# Altium footprint library General.PCBLIB: 231 footprints (part 2 of 15)
Each footprint in its own frame and in the unit in brackets; x right, y up, seen from the top. Pads: shape width x height; smd on the part's side, far side on the other; paste and mask are expansions set on the pad; w line width, h text height; cw(c..) or ccw(c..) is an arc to the next point about the centre after c.
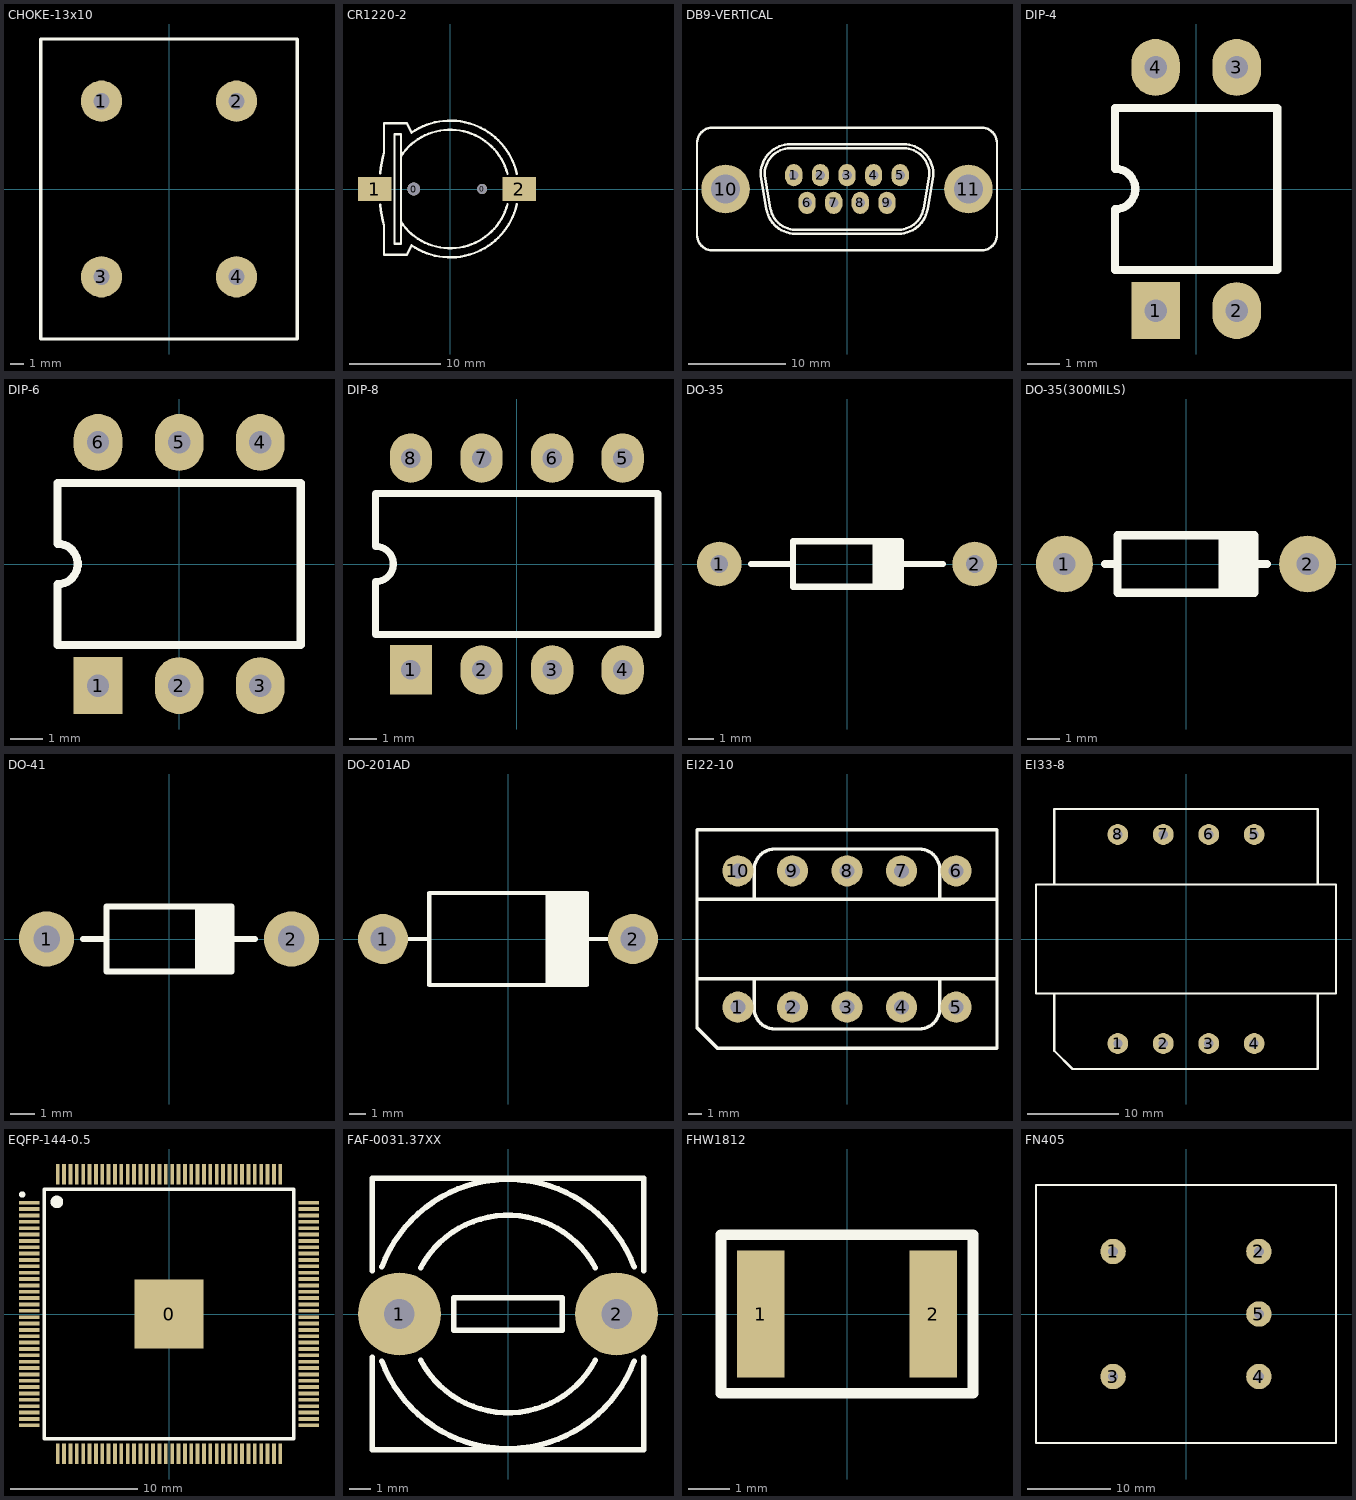
[diagram p1: the footprints below, top view; thin cyan lines are the x and y axes]

## CHOKE-13x10 [mm] "Choke"
height 27.2
pads (4):
  round 3.048 hole 1.2: 1(-5,6.5) 2(5,6.5) 3(-5,-6.5) 4(5,-6.5)
Top Overlay:
  lines w0.254: -9.5,-11.1 -9.5,11.1 9.5,11.1 9.5,-11.1 -9.5,-11.1
3D body "Choke_13x10.step": height 27.18, standoff -3.6, extent -9.5,-11.1 9.5,11.058

## CR1220-2 [mm]
pads (4):
  round 1.4 hole 1.4 unplated: 0(-4,0)
  round 1.1 hole 1.1 unplated: 0(3.5,0)
  rect 3.66x2.6 smd: 1(-8.28,0) 2(7.57,0)
Top Overlay:
  lines w0.254: -7.685,-1.73 ccw(c7.5,0) -7.25,-4 -7.25,-7.2 -4.75,-7.2 -4.25,-6.18 ccw(c0,0) 7.308,-1.687 ; -7.685,1.73 cw(c7.5,0) -7.25,4 -7.25,7.2 -4.75,7.2 -4.25,6.18 cw(c0,0) 7.308,1.687 ; -5.399,-3.619 ccw(c0,0) 6.279,-1.682 ; -5.399,3.619 cw(c0,0) 6.279,1.682 ; -6.1,-6 -5.4,-6 -5.4,6 -6.1,6 -6.1,-6
3D body "CR1220.STEP": height 4, standoff -0.94, extent -9.5,-7.5 9,7.497

## DB9-VERTICAL [mm] "D-Subminiature Connector"
height 12
pads (11):
  oval 1.778x2.286 hole 1: 1(-5.48,1.42) 2(-2.74,1.42) 3(0,1.42) 4(2.74,1.42) 5(5.48,1.42) 6(-4.11,-1.42) 7(-1.37,-1.42) 8(1.37,-1.42) 9(4.11,-1.42)
  round 5 / inner round 3 / far side round 7.5 hole 3: 10(-12.495,0) 11(12.495,0)
Top Overlay:
  lines w0.254: -15.443,-4.724 ccw(c-13.868,-4.724) -13.868,-6.299 13.868,-6.299 ccw(c13.868,-4.724) 15.443,-4.724 15.443,4.724 ccw(c13.868,4.724) 13.868,6.299 -13.868,6.299 ccw(c-13.868,4.724) -15.443,4.724 -15.443,-4.724 ; -8.841,1.018 cw(c-5.829,1.549) -5.829,4.608 5.829,4.608 cw(c5.829,1.549) 8.841,1.018 8.295,-2.08 cw(c5.283,-1.549) 5.283,-4.608 -5.283,-4.608 cw(c-5.283,-1.549) -8.295,-2.08 -8.841,1.018 ; -8.431,1.091 cw(c-5.829,1.549) -5.829,4.191 5.829,4.191 cw(c5.829,1.549) 8.431,1.091 7.884,-2.008 cw(c5.283,-1.549) 5.283,-4.191 -5.283,-4.191 cw(c-5.283,-1.549) -7.884,-2.008 -8.431,1.091
3D body "DB9-PIN-1.STEP": height 11.9, standoff -3.2, extent -15.39,-6.275 15.39,6.275

## DIP-4 [mil] "Dual In-line Package, 4PIN"
height 196.85
pads (4):
  rect 60x70 hole 27.56: 1(-50,-150)
  oval 60x70 hole 27.56: 2(50,-150) 3(50,150) 4(-50,150)
Top Overlay:
  lines w10: -100,-100 -100,-25 ccw(c-100,0) -100,25 -100,100 100,100 100,-100 -100,-100
3D body "DIP-4.STEP": height 175.2, standoff -98.43, extent -90.16,-179.13 90.16,167.32

## DIP-6 [mil] "Dual In-line Package, 6PIN"
height 196.85
pads (6):
  rect 60x70 hole 27.56: 1(-100,-150)
  oval 60x70 hole 27.56: 2(0,-150) 3(100,-150) 4(100,150) 5(0,150) 6(-100,150)
Top Overlay:
  lines w10: -150,-100 150,-100 150,100 -150,100 -150,25 cw(c-150,0) -150,-25 -150,-100
3D body "DIP-6.STEP": height 177.17, standoff -110.24, extent -140.16,-154.92 140.16,154.92

## DIP-8 [mil] "Dual In-line Package, 8PIN"
height 196.85
pads (8):
  rect 60x70 hole 27.56: 1(-150,-150)
  oval 60x70 hole 27.56: 2(-50,-150) 3(50,-150) 4(150,-150) 5(150,150) 6(50,150) 7(-50,150) 8(-150,150)
Top Overlay:
  lines w10: -200,-100 -200,-25 ccw(c-200,0) -200,25 -200,100 200,100 200,-100 -200,-100
3D body "DIP-8.STEP": height 179.92, standoff -150, extent -195.08,-153.94 195.08,153.94

## DO-35 [mil] "DO-35"
height 70.87
pads (2):
  round 70 hole 27.56: 1(-200,0) 2(200,0)
Top Overlay:
  lines w10: -150,0 -84.65,0 ; -84.65,-35.43 -84.65,35.43 84.65,35.43 84.65,-35.43 ; -83.66,-35.43 83.66,-35.43 ; 45.28,-35.43 45.28,35.43 ; 53.15,-35.43 53.15,35.43 ; 61.02,-35.43 61.02,35.43 ; 68.9,-35.43 68.9,35.43 ; 76.77,-35.43 76.77,35.43 ; 84.65,0 150,0
3D body "DO-35.STEP": height 68.75, standoff -115.75, extent -210.43,-34.45 210.55,34.55

## DO-35(300MILS) [mil] "DO-35"
height 70.87
pads (2):
  round 70 hole 27.56: 1(-150,0) 2(150,0)
Top Overlay:
  lines w10: -100,0 -84.65,0 ; -84.65,-35.43 -84.65,35.43 84.65,35.43 84.65,-35.43 ; -83.66,-35.43 83.66,-35.43 ; 45.28,-35.43 45.28,35.43 ; 53.15,-35.43 53.15,35.43 ; 61.02,-35.43 61.02,35.43 ; 68.9,-35.43 68.9,35.43 ; 76.77,-35.43 76.77,35.43 ; 84.65,0 100,0
3D body "DO-35 300mils.STEP": height 76.38, standoff -99.21, extent -160.24,-37.8 160.24,37.8

## DO-41 [mil] "DO-41"
height 106.3
pads (2):
  round 90 hole 43.31: 1(-200,0) 2(200,0)
Top Overlay:
  lines w10: -140.16,0 -102.36,0 ; 47.24,-53.15 47.24,53.15 ; 55.12,-53.15 55.12,53.15 ; 62.99,-53.15 62.99,53.15 ; 70.87,-53.15 70.87,53.15 ; 78.74,-53.15 78.74,53.15 ; 86.61,-53.15 86.61,53.15 ; 94.49,-53.15 94.49,53.15 ; 102.36,0 140.16,0 ; -102.36,-53.15 -102.36,53.15 102.36,53.15 102.36,-53.15 -102.36,-53.15
3D body "DO-41.STEP": height 107.48, standoff -103.15, extent -216.93,-53.15 216.93,53.15

## DO-201AD [mil] "DO-201AD"
height 80
pads (2):
  round 120 hole 59.06: 1(-300,0) 2(300,0)
Top Overlay:
  lines w10: -240.16,0 -188.98,0 ; 94.49,-110.24 94.49,110.24 ; 102.36,-110.24 102.36,110.24 ; 110.24,-110.24 110.24,110.24 ; 118.11,-110.24 118.11,110.24 ; 125.98,-110.24 125.98,110.24 ; 133.86,-110.24 133.86,110.24 ; 141.73,-110.24 141.73,110.24 ; 149.61,-110.24 149.61,110.24 ; 157.48,-110.24 157.48,110.24 ; 165.35,-110.24 165.35,110.24 ; 173.23,-110.24 173.23,110.24 ; 181.1,-110.24 181.1,110.24 ; 188.98,0 240.16,0 ; -188.98,-110.24 -188.98,110.24 188.98,110.24 188.98,-110.24 -188.98,-110.24
3D body "DO-201AD.STEP": height 221.26, standoff -235.43, extent -325.98,-110.24 325.98,110.24

## EI22-10 [mm] "Transformer, EI22"
height 20
pads (10):
  round 2.286 hole 1.1: 1(-8,-5) 2(-4,-5) 3(0,-5) 4(4,-5) 5(8,-5) 6(8,5) 7(4,5) 8(0,5) 9(-4,5) 10(-8,5)
Top Overlay:
  lines w0.254: -6.8,-2.9 -6.8,-5.1 ccw(c-5.3,-5.1) -5.3,-6.6 5.3,-6.6 ccw(c5.3,-5.1) 6.8,-5.1 6.8,-2.9 ; -6.8,2.9 -6.8,5.1 cw(c-5.3,5.1) -5.3,6.6 5.3,6.6 cw(c5.3,5.1) 6.8,5.1 6.8,2.9 ; -11,-2.9 -11,2.9 ; -11,-2.9 11,-2.9 ; -11,-2.9 -11,-6.5 -9.5,-8 11,-8 11,-2.9 ; -11,2.9 11,2.9 ; -11,2.9 -11,8 11,8 11,2.9 ; 11,-2.9 11,2.9
3D body "TRANSFORMER-EE22.STEP": height 19.81, standoff -4, extent -10,-8.03 10.02,8

## EI33-8 [mm] "Transformer, EI33"
height 32
pads (8):
  round 2.286 hole 1: 1(-7.5,-11.5) 2(-2.5,-11.5) 3(2.5,-11.5) 4(7.5,-11.5) 5(7.5,11.5) 6(2.5,11.5) 7(-2.5,11.5) 8(-7.5,11.5)
Top Overlay:
  lines w0.254: -14.5,-6 -14.5,-12.3 -12.5,-14.3 14.5,-14.3 14.5,-6 ; -14.5,6 -14.5,14.3 14.5,14.3 14.5,6 ; -16.5,-6 -16.5,6 16.5,6 16.5,-6 -16.5,-6
3D body "EI33.step": height 32.02, standoff -3.5, extent -16.5,-14.3 16.5,14.3

## EQFP-144-0.5 [mm] "EQFP-144"
height 1.6
pads (145):
  rect 5.4x5.4 smd: 0(0,0)
  rect 1.6x0.3 smd: 1(-11,8.75) 2(-11,8.25) 3(-11,7.75) 4(-11,7.25) 5(-11,6.75) 6(-11,6.25) 7(-11,5.75) 8(-11,5.25) 9(-11,4.75) 10(-11,4.25) 11(-11,3.75) 12(-11,3.25) 13(-11,2.75) 14(-11,2.25) 15(-11,1.75) 16(-11,1.25) 17(-11,0.75) 18(-11,0.25) 19(-11,-0.25) 20(-11,-0.75) 21(-11,-1.25) 22(-11,-1.75) 23(-11,-2.25) 24(-11,-2.75) 25(-11,-3.25) 26(-11,-3.75) 27(-11,-4.25) 28(-11,-4.75) 29(-11,-5.25) 30(-11,-5.75) 31(-11,-6.25) 32(-11,-6.75) 33(-11,-7.25) 34(-11,-7.75) 35(-11,-8.25) 36(-11,-8.75) 73(11,-8.75) 74(11,-8.25) 75(11,-7.75) 76(11,-7.25) 77(11,-6.75) 78(11,-6.25) 79(11,-5.75) 80(11,-5.25) 81(11,-4.75) 82(11,-4.25) 83(11,-3.75) 84(11,-3.25) 85(11,-2.75) 86(11,-2.25) 87(11,-1.75) 88(11,-1.25) 89(11,-0.75) 90(11,-0.25) 91(11,0.25) 92(11,0.75) 93(11,1.25) 94(11,1.75) 95(11,2.25) 96(11,2.75) 97(11,3.25) 98(11,3.75) 99(11,4.25) 100(11,4.75) 101(11,5.25) 102(11,5.75) 103(11,6.25) 104(11,6.75) 105(11,7.25) 106(11,7.75) 107(11,8.25) 108(11,8.75)
  rect 0.3x1.6 smd: 37(-8.75,-11) 38(-8.25,-11) 39(-7.75,-11) 40(-7.25,-11) 41(-6.75,-11) 42(-6.25,-11) 43(-5.75,-11) 44(-5.25,-11) 45(-4.75,-11) 46(-4.25,-11) 47(-3.75,-11) 48(-3.25,-11) 49(-2.75,-11) 50(-2.25,-11) 51(-1.75,-11) 52(-1.25,-11) 53(-0.75,-11) 54(-0.25,-11) 55(0.25,-11) 56(0.75,-11) 57(1.25,-11) 58(1.75,-11) 59(2.25,-11) 60(2.75,-11) 61(3.25,-11) 62(3.75,-11) 63(4.25,-11) 64(4.75,-11) 65(5.25,-11) 66(5.75,-11) 67(6.25,-11) 68(6.75,-11) 69(7.25,-11) 70(7.75,-11) 71(8.25,-11) 72(8.75,-11) 109(8.75,11) 110(8.25,11) 111(7.75,11) 112(7.25,11) 113(6.75,11) 114(6.25,11) 115(5.75,11) 116(5.25,11) 117(4.75,11) 118(4.25,11) 119(3.75,11) 120(3.25,11) 121(2.75,11) 122(2.25,11) 123(1.75,11) 124(1.25,11) 125(0.75,11) 126(0.25,11) 127(-0.25,11) 128(-0.75,11) 129(-1.25,11) 130(-1.75,11) 131(-2.25,11) 132(-2.75,11) 133(-3.25,11) 134(-3.75,11) 135(-4.25,11) 136(-4.75,11) 137(-5.25,11) 138(-5.75,11) 139(-6.25,11) 140(-6.75,11) 141(-7.25,11) 142(-7.75,11) 143(-8.25,11) 144(-8.75,11)
Top Overlay:
  circle w0.254: c-11.55,9.4 r0.127
  circle w0.5: c-8.82,8.82 r0.25
  lines w0.254: -9.82,-9.82 9.82,-9.82 9.82,9.82 -9.82,9.82 -9.82,-9.82
3D body "TQFP-144.STEP": height 1.65, standoff 0, extent -11,-11 11,11

## FAF-0031.37XX [mm] "Fuse holder, SCHURTER"
height 33.9
pads (2):
  round 3.81 hole 1.4: 1(-5,0) 2(5,0)
Top Overlay:
  lines w0.254: -6.25,-2 -6.25,-6.25 6.25,-6.25 6.25,-2 ; -6.25,2 -6.25,6.25 6.25,6.25 6.25,2 ; -5.807,-2.171 ccw(c0,0) 5.807,-2.171 ; -5.807,2.171 cw(c0,0) 5.807,2.171 ; -4.017,-2.136 ccw(c0,0) 4.017,-2.136 ; -4.017,2.136 cw(c0,0) 4.017,2.136 ; -2.5,-0.75 -2.5,0.75 2.5,0.75 2.5,-0.75 -2.5,-0.75
3D body "FAF 31-3751.step": height 32.8, standoff -4.5, extent -6.25,-6.25 6.25,6.25

## FHW1812 [mm] "FENGHUA, Inductor, SMD, 1812"
height 1.6
pads (2):
  rect 1.14x3.05 smd: 1(-2.07,0) 2(2.07,0)
Top Overlay:
  lines w0.254: -3.02,-1.9 3.02,-1.9 3.02,1.9 -3.02,1.9 -3.02,-1.9
3D body "Coilcraft-1812LS.STEP": height 3.42, standoff -0.01, extent -2.475,-1.905 2.475,1.905

## FN405 [mm] "SCHAFFNER PCB Filters"
height 19.5
pads (5):
  round 3.048 hole 1.2: 1(-8.75,7.5) 2(8.75,7.5) 3(-8.75,-7.5) 4(8.75,-7.5) 5(8.75,0)
Top Overlay:
  lines w0.254: -18,-15.5 -18,15.5 18,15.5 18,-15.5 -18,-15.5
3D body: height 19.5, standoff 0, extent -18,-15.5 18,15.5